# Altium integrated library Altium_MCU.IntLib: 42 symbols (continued)
## ESP32-S3-WROOM-1-N16
designator U?
Xtensa® 32-bit LX7 dual-core processor that operates at up to 240 MHz; Manufacturer: Espressif Systems; Supply Voltage - Max: 3.6 V; Supply Voltage - Min: 3 V; Flash size: 16MB; Part Number: ESP32-S3-WROOM-1-N16; Supplier 1 URL: N/A; Supplier 2 URL: https://www.digikey.com/en/products/detail/espressif-systems/ESP32-S3-WROOM-1-N16/16162647; Supplier 3 URL: N/A; Value: ESP32-S3-WROOM-1-N16; Manufacturer Part Number: ESP32-S3-WROOM-1-N16; Packaging: Tape and Reel; Supplier 1: Mouser; Supplier 1 Part Number: N/A; Supplier 2: Digi-Key; Supplier 2 Part Number: 1965-ESP32-S3-WROOM-1-N16TR-ND; Supplier 3: thegioiic; Supplier 3 Part Number: N/A; Mount: SMD/SMT; Operating Temperature Max: + 85 C; Operating Temperature Min: - 40 C; ComponentLink1Description: Datasheet; ComponentLink1URL: https://www.mouser.com/datasheet/2/891/esp32_s3_wroom_1_wroom_1u_datasheet_en-2930317.pdf; LCSC Part #: C2913199; Ram size: N/A
footprint ESP32_SOLO_OB_ANTENNA
pins: 1 GND, 2 VCC, 3 EN, 4 IO4, 5 IO5, 6 IO6, 7 IO7, 8 MTDO/IO15, 9 IO16, 10 IO17, 11 IO18, 12 IO8, 13 IO19, 14 IO20, 15 IO3, 16 IO46, 17 IO9, 18 IO10, 19 IO11, 20 IO12/MTDI, 21 IO13, 22 IO14, 23 IO21, 24 IO47, 25 IO48, 26 IO45, 27 IO0, 28 IO35, 29 IO36, 30 IO37, 31 IO38, 32 IO39, 33 IO40, 34 IO41, 35 IO42, 36 RXD0, 37 TXD0, 38 IO2, 39 IO1, 40 GND
text: ANTENNA INCLUDED

## ESP32-S3-WROOM-1-N16R8
designator U?
Xtensa® 32-bit LX7 dual-core processor that operates at up to 240 MHz; Manufacturer: Espressif Systems; Supply Voltage - Max: 3.6 V; Supply Voltage - Min: 3 V; Flash size: 16MB; Ram size: 8MB; Part Number: ESP32-S3-WROOM-1-N16R8; Supplier 1 URL: N/A; Supplier 2 URL: https://www.digikey.com/en/products/detail/espressif-systems/ESP32-S3-WROOM-1-N16R8/16162642; Supplier 3 URL: N/A; Value: ESP32-S3-WROOM-1-N16R8; Manufacturer Part Number: ESP32-S3-WROOM-1-N16R8; Packaging: Tape and Reel; Supplier 1: Mouser; Supplier 1 Part Number: N/A; Supplier 2: Digi-Key; Supplier 2 Part Number: 1965-ESP32-S3-WROOM-1-N16R8TR-ND; Supplier 3: thegioiic; Supplier 3 Part Number: N/A; Mount: SMD/SMT; Operating Temperature Max: + 85 C; Operating Temperature Min: - 40 C; ComponentLink1Description: Datasheet; ComponentLink1URL: https://www.mouser.com/datasheet/2/891/esp32_s3_wroom_1_wroom_1u_datasheet_en-2930317.pdf; LCSC Part #: C2913202
footprint ESP32_SOLO_OB_ANTENNA
pins: 1 GND, 2 VCC, 3 EN, 4 IO4, 5 IO5, 6 IO6, 7 IO7, 8 MTDO/IO15, 9 IO16, 10 IO17, 11 IO18, 12 IO8, 13 IO19, 14 IO20, 15 IO3, 16 IO46, 17 IO9, 18 IO10, 19 IO11, 20 IO12/MTDI, 21 IO13, 22 IO14, 23 IO21, 24 IO47, 25 IO48, 26 IO45, 27 IO0, 28 IO35, 29 IO36, 30 IO37, 31 IO38, 32 IO39, 33 IO40, 34 IO41, 35 IO42, 36 RXD0, 37 TXD0, 38 IO2, 39 IO1, 40 GND
text: ANTENNA INCLUDED

## ESP32-S3-WROOM-1U-N8R8
designator U?
Xtensa® 32-bit LX7 dual-core processor that operates at up to 240 MHz; Manufacturer: Espressif Systems; Supply Voltage - Max: 3.6 V; Supply Voltage - Min: 3 V; Flash size: 8MB; Part Number: ESP32-S3-WROOM-1U-N8R8; Supplier 1 URL: N/A; Supplier 2 URL: https://www.digikey.com/en/products/detail/espressif-systems/ESP32-S3-WROOM-1U-N8R8/16162638; Supplier 3 URL: N/A; Value: ESP32-S3-WROOM-1U-N8R8; Manufacturer Part Number: ESP32-S3-WROOM-1U-N8R8; Packaging: Tape and Reel; Supplier 1: Mouser; Supplier 1 Part Number: N/A; Supplier 2: Digi-Key; Supplier 2 Part Number: 1965-ESP32-S3-WROOM-1U-N8R8TR-ND; Supplier 3: thegioiic; Supplier 3 Part Number: N/A; Mount: SMD/SMT; Operating Temperature Max: + 85 C; Operating Temperature Min: - 40 C; ComponentLink1Description: Datasheet; ComponentLink1URL: https://www.mouser.com/datasheet/2/891/esp32_s3_wroom_1_wroom_1u_datasheet_en-2930317.pdf; LCSC Part #: C2980300; Ram size: 8MB
footprint ESP32_SOLO
pins: 1 GND, 2 VCC, 3 EN, 4 IO4, 5 IO5, 6 IO6, 7 IO7, 8 MTDO/IO15, 9 IO16, 10 IO17, 11 IO18, 12 IO8, 13 IO19, 14 IO20, 15 IO3, 16 IO46, 17 IO9, 18 IO10, 19 IO11, 20 IO12/MTDI, 21 IO13, 22 IO14, 23 IO21, 24 IO47, 25 IO48, 26 IO45, 27 IO0, 28 IO35, 29 IO36, 30 IO37, 31 IO38, 32 IO39, 33 IO40, 34 IO41, 35 IO42, 36 RXD0, 37 TXD0, 38 IO2, 39 IO1, 40 GND

## ESP32-S3-WROOM-1U-N16R2
designator U?
Xtensa® 32-bit LX7 dual-core processor that operates at up to 240 MHz; Manufacturer: Espressif Systems; Supply Voltage - Max: 3.6 V; Supply Voltage - Min: 3 V; Flash size: 16MB; Part Number: ESP32-S3-WROOM-1U-N16R2; Supplier 1 URL: N/A; Supplier 2 URL: https://www.digikey.com/en/products/detail/espressif-systems/ESP32-S3-WROOM-1U-N16R2/16162650; Supplier 3 URL: N/A; Value: ESP32-S3-WROOM-1U-N16R2; Manufacturer Part Number: ESP32-S3-WROOM-1U-N16R2; Packaging: Tape and Reel; Supplier 1: Mouser; Supplier 1 Part Number: N/A; Supplier 2: Digi-Key; Supplier 2 Part Number: 1965-ESP32-S3-WROOM-1U-N16R2TR-ND; Supplier 3: thegioiic; Supplier 3 Part Number: N/A; Mount: SMD/SMT; Operating Temperature Max: + 85 C; Operating Temperature Min: - 40 C; ComponentLink1Description: Datasheet; ComponentLink1URL: https://www.mouser.com/datasheet/2/891/esp32_s3_wroom_1_wroom_1u_datasheet_en-2930317.pdf; LCSC Part #: C3013945; Ram size: N/A
footprint ESP32_SOLO
pins: 1 GND, 2 VCC, 3 EN, 4 IO4, 5 IO5, 6 IO6, 7 IO7, 8 MTDO/IO15, 9 IO16, 10 IO17, 11 IO18, 12 IO8, 13 IO19, 14 IO20, 15 IO3, 16 IO46, 17 IO9, 18 IO10, 19 IO11, 20 IO12/MTDI, 21 IO13, 22 IO14, 23 IO21, 24 IO47, 25 IO48, 26 IO45, 27 IO0, 28 IO35, 29 IO36, 30 IO37, 31 IO38, 32 IO39, 33 IO40, 34 IO41, 35 IO42, 36 RXD0, 37 TXD0, 38 IO2, 39 IO1, 40 GND

## ESP32-S3-WROOM-1U-N16R8
designator U?
Xtensa® 32-bit LX7 dual-core processor that operates at up to 240 MHz; Manufacturer: Espressif Systems; Supply Voltage - Max: 3.6 V; Supply Voltage - Min: 3 V; Flash size: 16MB; Ram size: 8MB; Part Number: ESP32-S3-WROOM-1U-N16R8; Supplier 1 URL: N/A; Supplier 2 URL: https://www.digikey.com/en/products/detail/espressif-systems/ESP32-S3-WROOM-1U-N16R8/16162641; Supplier 3 URL: N/A; Value: ESP32-S3-WROOM-1U-N16R8; Manufacturer Part Number: ESP32-S3-WROOM-1U-N16R8; Packaging: Tape and Reel; Supplier 1: Mouser; Supplier 1 Part Number: N/A; Supplier 2: Digi-Key; Supplier 2 Part Number: 1965-ESP32-S3-WROOM-1U-N16R8TR-ND; Supplier 3: thegioiic; Supplier 3 Part Number: N/A; Mount: SMD/SMT; Operating Temperature Max: + 85 C; Operating Temperature Min: - 40 C; ComponentLink1Description: Datasheet; ComponentLink1URL: https://www.mouser.com/datasheet/2/891/esp32_s3_wroom_1_wroom_1u_datasheet_en-2930317.pdf; LCSC Part #: C3013946
footprint ESP32_SOLO
pins: 1 GND, 2 VCC, 3 EN, 4 IO4, 5 IO5, 6 IO6, 7 IO7, 8 MTDO/IO15, 9 IO16, 10 IO17, 11 IO18, 12 IO8, 13 IO19, 14 IO20, 15 IO3, 16 IO46, 17 IO9, 18 IO10, 19 IO11, 20 IO12/MTDI, 21 IO13, 22 IO14, 23 IO21, 24 IO47, 25 IO48, 26 IO45, 27 IO0, 28 IO35, 29 IO36, 30 IO37, 31 IO38, 32 IO39, 33 IO40, 34 IO41, 35 IO42, 36 RXD0, 37 TXD0, 38 IO2, 39 IO1, 40 GND

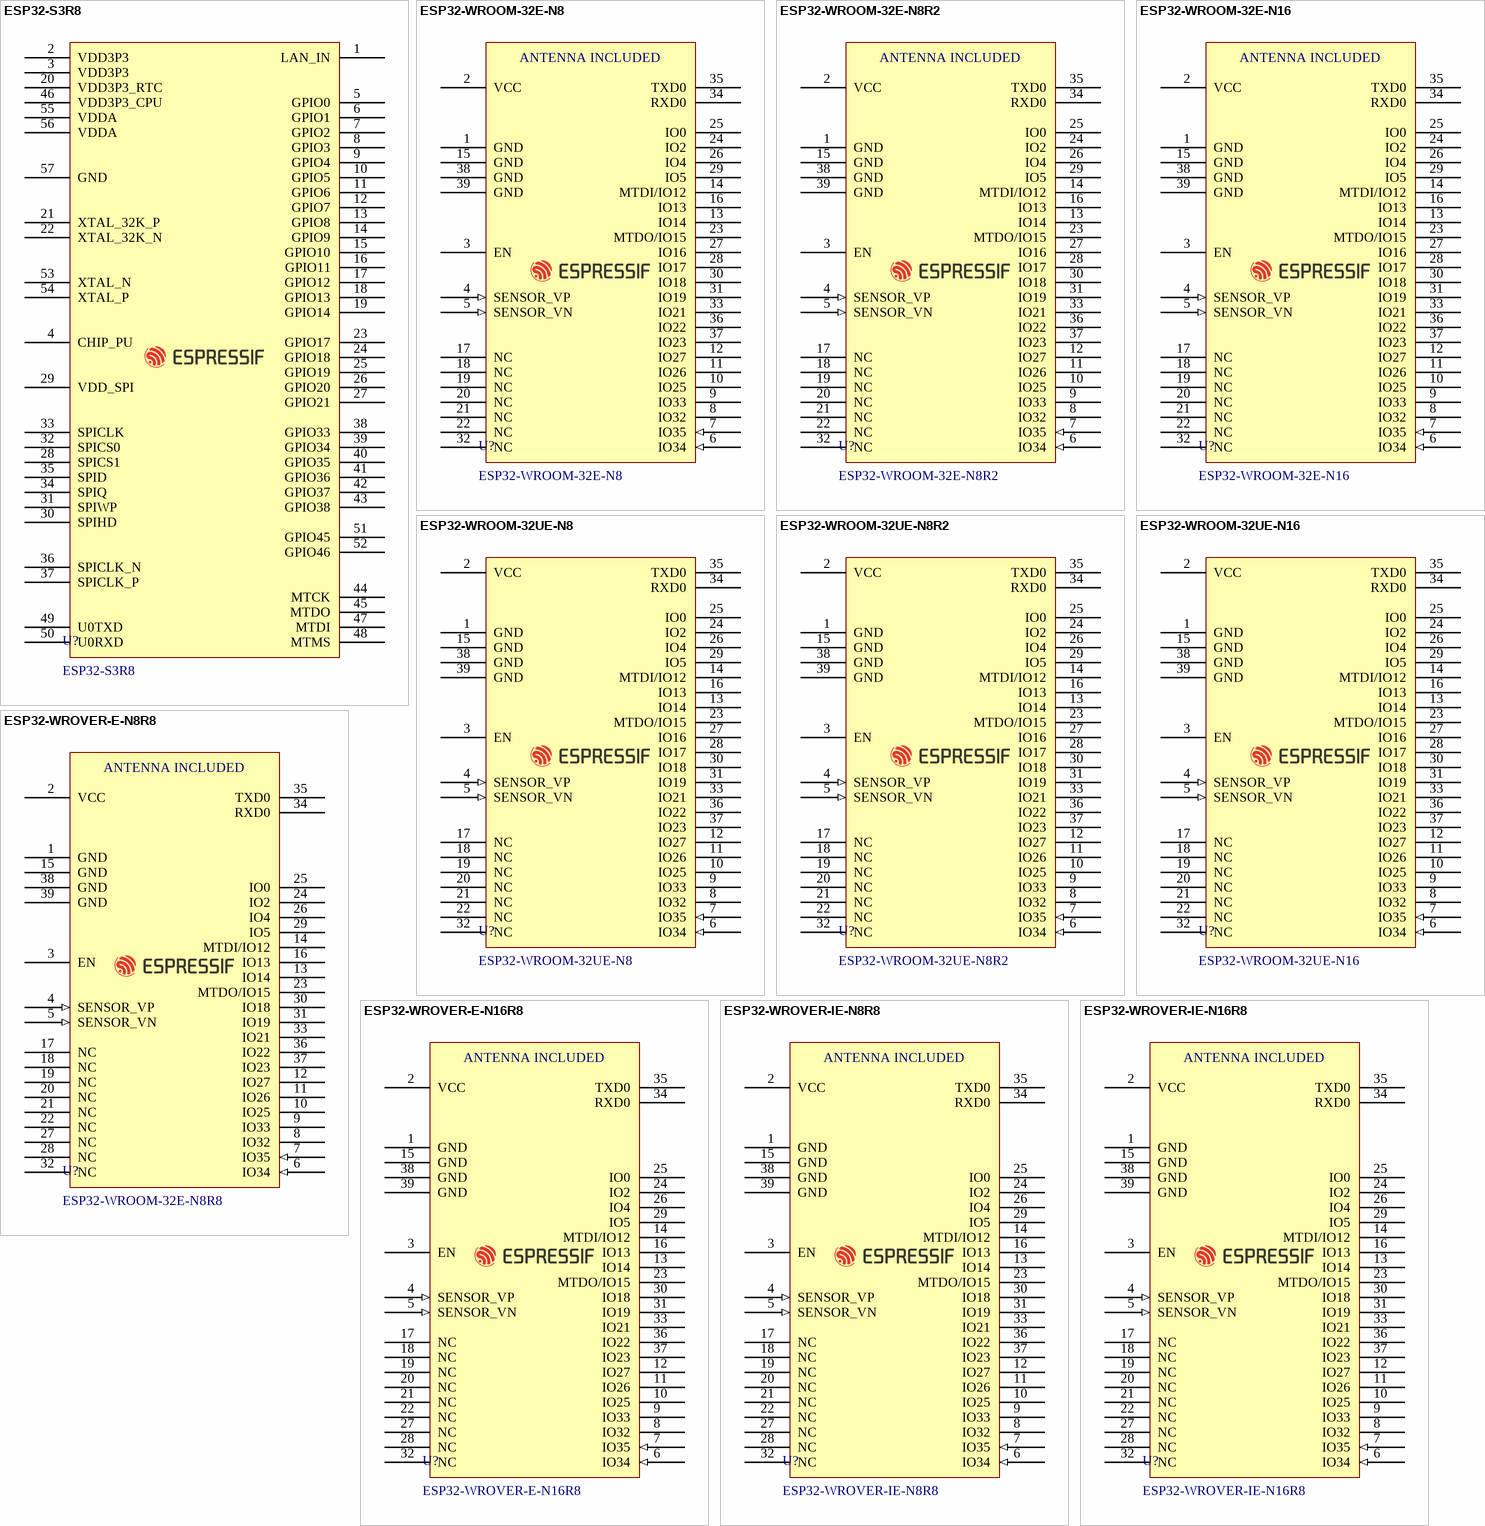
[diagram p2: symbols ESP32-S3R8 to ESP32-WROVER-IE-N16R8]

## ESP32-S3R8
designator U?
RF System on a Chip - SoC SMD IC ESP32-S3R8, dual-core MCU, Wi-Fi 2.4G & BLE 5.0 combo, 8 MB Octal SPI PSRAM die inside, QFN 56-pin, 7*7 mm; Manufacturer: Espressif Systems; Supply Voltage - Max: 3.6 V; Supply Voltage - Min: 3 V; Ram size: 8MB; Part Number: ESP32-S3R8; Supplier 1 URL: https://www.mouser.com/ProductDetail/Espressif-Systems/ESP32-S3R8?qs=Rp5uXu7WBW%252Bto4RqH8CMng%3D%3D; Supplier 2 URL: https://www.digikey.com/en/products/detail/espressif-systems/esp32-s3r8/15822451; Supplier 3 URL: N/A; Value: ESP32-S3R8; Manufacturer Part Number: ESP32-S3R8; Packaging: Tape and Reel; Supplier 1: Mouser; Supplier 1 Part Number: 356-ESP32-S3R8; Supplier 2: Digi-Key; Supplier 2 Part Number: 1904-ESP32-S3R8TR-ND; Supplier 3: thegioiic; Supplier 3 Part Number: N/A; Mount: SMD/SMT; Operating Temperature Max: + 85 C; Operating Temperature Min: - 40 C; ComponentLink1Description: Datasheet; ComponentLink1URL: https://www.lcsc.com/datasheet/C2913194.pdf; LCSC Part #: C2913194; Flash size: N/A
footprint QFN40P700X700X90_HS-57N (QFN, 56-Leads, Body 7.00x7.00mm, Pitch 0.40mm, Thermal Pad 4.00x4.00mm, IPC Medium Density)
pins: 1 LAN_IN, 2 VDD3P3, 3 VDD3P3, 4 CHIP_PU, 5 GPIO0, 6 GPIO1, 7 GPIO2, 8 GPIO3, 9 GPIO4, 10 GPIO5, 11 GPIO6, 12 GPIO7, 13 GPIO8, 14 GPIO9, 15 GPIO10, 16 GPIO11, 17 GPIO12, 18 GPIO13, 19 GPIO14, 20 VDD3P3_RTC, 21 XTAL_32K_P, 22 XTAL_32K_N, 23 GPIO17, 24 GPIO18, 25 GPIO19, 26 GPIO20, 27 GPIO21, 28 SPICS1, 29 VDD_SPI, 30 SPIHD, 31 SPIWP, 32 SPICS0, 33 SPICLK, 34 SPIQ, 35 SPID, 36 SPICLK_N, 37 SPICLK_P, 38 GPIO33, 39 GPIO34, 40 GPIO35, 41 GPIO36, 42 GPIO37, 43 GPIO38, 44 MTCK, 45 MTDO, 46 VDD3P3_CPU, 47 MTDI, 48 MTMS, 49 U0TXD, 50 U0RXD, 51 GPIO45, 52 GPIO46, 53 XTAL_N, 54 XTAL_P, 55 VDDA, 56 VDDA, 57 GND

## ESP32-WROOM-32E-N8
designator U?
These are ESP32-D0WD-based modules with integrated flash. These modules are well suited for Wi-Fi and Bluetooth/Bluetooth LE-based connectivity applications and provide a solid dual-core performance.; Manufacturer: Espressif Systems; Supply Voltage - Max: 3.6 V; Supply Voltage - Min: 3 V; Flash size: 8MB; Part Number: ESP32-WROOM-32E-N8; Supplier 1 URL: N/A; Supplier 2 URL: https://www.digikey.com/en/products/detail/espressif-systems/esp32-wroom-32e-n8/13159522; Supplier 3 URL: N/A; Value: ESP32-WROOM-32E-N8; Manufacturer Part Number: ESP32-WROOM-32E-N8; Packaging: Tape and Reel; Supplier 1: Mouser; Supplier 1 Part Number: N/A; Supplier 2: Digi-Key; Supplier 2 Part Number: 1965-ESP32-WROOM-32E-N8TR-ND; Supplier 3: thegioiic; Supplier 3 Part Number: N/A; Mount: SMD/SMT; Operating Temperature Max: + 85 C; Operating Temperature Min: - 40 C; ComponentLink1Description: Datasheet; ComponentLink1URL: https://www.mouser.com/datasheet/2/891/esp32_wroom_32e_esp32_wroom_32ue_datasheet_en-1855879.pdf; LCSC Part #: C701342; Ram size: N/A
footprint ESP32_WROOM_OB_ANTENNA
pins: 1 GND, 2 VCC, 3 EN, 4 SENSOR_VP (in), 5 SENSOR_VN (in), 6 IO34 (in), 7 IO35 (in), 8 IO32, 9 IO33, 10 IO25, 11 IO26, 12 IO27, 13 IO14, 14 MTDI/IO12, 15 GND, 16 IO13, 17 NC, 18 NC, 19 NC, 20 NC, 21 NC, 22 NC, 23 MTDO/IO15, 24 IO2, 25 IO0, 26 IO4, 27 IO16, 28 IO17, 29 IO5, 30 IO18, 31 IO19, 32 NC, 33 IO21, 34 RXD0, 35 TXD0, 36 IO22, 37 IO23, 38 GND, 39 GND
text: ANTENNA INCLUDED

## ESP32-WROOM-32E-N8R2
designator U?
These are ESP32-D0WD-based modules with integrated flash. These modules are well suited for Wi-Fi and Bluetooth/Bluetooth LE-based connectivity applications and provide a solid dual-core performance.; Manufacturer: Espressif Systems; Supply Voltage - Max: 3.6 V; Supply Voltage - Min: 3 V; Flash size: 8MB; Ram size: 2MB; Part Number: ESP32-WROOM-32E-N8R2; Supplier 1 URL: https://www.mouser.vn/ProductDetail/Espressif-Systems/ESP32-WROOM-32E-N8R2?qs=By6Nw2ByBD0mvGJSS3Ohlw%3D%3D; Supplier 2 URL: https://www.digikey.com/en/products/detail/espressif-systems/ESP32-WROOM-32E-N8R2/16733099?s=N4IgTCBcDaIKIGUAKBmMBaA6gJQPK4Fl0050A5ADmwgF0BfIA; Supplier 3 URL: N/A; Value: ESP32-WROOM-32E-N8R2; Manufacturer Part Number: ESP32-WROOM-32E-N8R2; Packaging: Tape and Reel; Supplier 1: Mouser; Supplier 1 Part Number: 356-ESP32WRM32EN8R2; Supplier 2: Digi-Key; Supplier 2 Part Number: 1965-ESP32-WROOM-32E-N8R2TR-ND; Supplier 3: thegioiic; Supplier 3 Part Number: N/A; Mount: SMD/SMT; Operating Temperature Max: + 85 C; Operating Temperature Min: - 40 C; ComponentLink1Description: Datasheet; ComponentLink1URL: https://www.mouser.com/datasheet/2/891/esp32_wroom_32e_esp32_wroom_32ue_datasheet_en-1855879.pdf; LCSC Part #: C5361945
footprint ESP32_WROOM_OB_ANTENNA
pins: 1 GND, 2 VCC, 3 EN, 4 SENSOR_VP (in), 5 SENSOR_VN (in), 6 IO34 (in), 7 IO35 (in), 8 IO32, 9 IO33, 10 IO25, 11 IO26, 12 IO27, 13 IO14, 14 MTDI/IO12, 15 GND, 16 IO13, 17 NC, 18 NC, 19 NC, 20 NC, 21 NC, 22 NC, 23 MTDO/IO15, 24 IO2, 25 IO0, 26 IO4, 27 IO16, 28 IO17, 29 IO5, 30 IO18, 31 IO19, 32 NC, 33 IO21, 34 RXD0, 35 TXD0, 36 IO22, 37 IO23, 38 GND, 39 GND
text: ANTENNA INCLUDED

## ESP32-WROOM-32E-N16
designator U?
These are ESP32-D0WD-based modules with integrated flash. These modules are well suited for Wi-Fi and Bluetooth/Bluetooth LE-based connectivity applications and provide a solid dual-core performance.; Manufacturer: Espressif Systems; Supply Voltage - Max: 3.6 V; Supply Voltage - Min: 3 V; Flash size: 16MB; Part Number: ESP32-WROOM-32E-N16; Supplier 1 URL: N/A; Supplier 2 URL: https://www.digikey.com/en/products/detail/espressif-systems/ESP32-WROOM-32E-16MB/11613144; Supplier 3 URL: N/A; Value: ESP32-WROOM-32E-N16; Manufacturer Part Number: ESP32-WROOM-32E-N16; Packaging: Tape and Reel; Supplier 1: Mouser; Supplier 1 Part Number: N/A; Supplier 2: Digi-Key; Supplier 2 Part Number: 1965-ESP32-WROOM-32E-N16TR-ND; Supplier 3: thegioiic; Supplier 3 Part Number: N/A; Mount: SMD/SMT; Operating Temperature Max: + 85 C; Operating Temperature Min: - 40 C; ComponentLink1Description: Datasheet; ComponentLink1URL: https://www.mouser.com/datasheet/2/891/esp32_wroom_32e_esp32_wroom_32ue_datasheet_en-1855879.pdf; LCSC Part #: C701343; Ram size: N/A
footprint ESP32_WROOM_OB_ANTENNA
pins: 1 GND, 2 VCC, 3 EN, 4 SENSOR_VP (in), 5 SENSOR_VN (in), 6 IO34 (in), 7 IO35 (in), 8 IO32, 9 IO33, 10 IO25, 11 IO26, 12 IO27, 13 IO14, 14 MTDI/IO12, 15 GND, 16 IO13, 17 NC, 18 NC, 19 NC, 20 NC, 21 NC, 22 NC, 23 MTDO/IO15, 24 IO2, 25 IO0, 26 IO4, 27 IO16, 28 IO17, 29 IO5, 30 IO18, 31 IO19, 32 NC, 33 IO21, 34 RXD0, 35 TXD0, 36 IO22, 37 IO23, 38 GND, 39 GND
text: ANTENNA INCLUDED

## ESP32-WROOM-32UE-N8
designator U?
These are ESP32-D0WD-based modules with integrated flash. These modules are well suited for Wi-Fi and Bluetooth/Bluetooth LE-based connectivity applications and provide a solid dual-core performance.; Manufacturer: Espressif Systems; Supply Voltage - Max: 3.6 V; Supply Voltage - Min: 3 V; Flash size: 8MB; Part Number: ESP32-WROOM-32UE-N8; Supplier 1 URL: N/A; Supplier 2 URL: https://www.digikey.com/en/products/detail/espressif-systems/ESP32-WROOM-32UE-8MB/11613142; Supplier 3 URL: N/A; Value: ESP32-WROOM-32UE-N8; Manufacturer Part Number: ESP32-WROOM-32UE-N8; Packaging: Tape and Reel; Supplier 1: Mouser; Supplier 1 Part Number: N/A; Supplier 2: Digi-Key; Supplier 2 Part Number: 1965-ESP32-WROOM-32UE-N8TR-ND; Supplier 3: thegioiic; Supplier 3 Part Number: N/A; Mount: SMD/SMT; Operating Temperature Max: + 85 C; Operating Temperature Min: - 40 C; ComponentLink1Description: Datasheet; ComponentLink1URL: https://www.mouser.com/datasheet/2/891/esp32_wroom_32e_esp32_wroom_32ue_datasheet_en-1855879.pdf; LCSC Part #: C701345; Ram size: N/A
footprint ESP32_WROOM
pins: 1 GND, 2 VCC, 3 EN, 4 SENSOR_VP (in), 5 SENSOR_VN (in), 6 IO34 (in), 7 IO35 (in), 8 IO32, 9 IO33, 10 IO25, 11 IO26, 12 IO27, 13 IO14, 14 MTDI/IO12, 15 GND, 16 IO13, 17 NC, 18 NC, 19 NC, 20 NC, 21 NC, 22 NC, 23 MTDO/IO15, 24 IO2, 25 IO0, 26 IO4, 27 IO16, 28 IO17, 29 IO5, 30 IO18, 31 IO19, 32 NC, 33 IO21, 34 RXD0, 35 TXD0, 36 IO22, 37 IO23, 38 GND, 39 GND

## ESP32-WROOM-32UE-N8R2
designator U?
These are ESP32-D0WD-based modules with integrated flash. These modules are well suited for Wi-Fi and Bluetooth/Bluetooth LE-based connectivity applications and provide a solid dual-core performance.; Manufacturer: Espressif Systems; Supply Voltage - Max: 3.6 V; Supply Voltage - Min: 3 V; Flash size: 8MB; Ram size: 2MB; Part Number: ESP32-WROOM-32UE-N8R2; Supplier 1 URL: N/A; Supplier 2 URL: https://www.digikey.com/en/products/detail/espressif-systems/ESP32-WROOM-32UE-N8R2/16733086?s=N4IgTCBcDaIKIGUAKBmMBaA6gJQPK4Fl00BVOdAOQA5sIBdAXyA; Supplier 3 URL: N/A; Value: ESP32-WROOM-32UE-N8R2; Manufacturer Part Number: ESP32-WROOM-32UE-N8R2; Packaging: Tape and Reel; Supplier 1: Mouser; Supplier 1 Part Number: N/A; Supplier 2: Digi-Key; Supplier 2 Part Number: 1965-ESP32-WROOM-32UE-N8R2TR-ND; Supplier 3: thegioiic; Supplier 3 Part Number: N/A; Mount: SMD/SMT; Operating Temperature Max: + 85 C; Operating Temperature Min: - 40 C; ComponentLink1Description: Datasheet; ComponentLink1URL: https://www.mouser.com/datasheet/2/891/esp32_wroom_32e_esp32_wroom_32ue_datasheet_en-1855879.pdf; LCSC Part #: N/A
footprint ESP32_WROOM
pins: 1 GND, 2 VCC, 3 EN, 4 SENSOR_VP (in), 5 SENSOR_VN (in), 6 IO34 (in), 7 IO35 (in), 8 IO32, 9 IO33, 10 IO25, 11 IO26, 12 IO27, 13 IO14, 14 MTDI/IO12, 15 GND, 16 IO13, 17 NC, 18 NC, 19 NC, 20 NC, 21 NC, 22 NC, 23 MTDO/IO15, 24 IO2, 25 IO0, 26 IO4, 27 IO16, 28 IO17, 29 IO5, 30 IO18, 31 IO19, 32 NC, 33 IO21, 34 RXD0, 35 TXD0, 36 IO22, 37 IO23, 38 GND, 39 GND

## ESP32-WROOM-32UE-N16
designator U?
These are ESP32-D0WD-based modules with integrated flash. These modules are well suited for Wi-Fi and Bluetooth/Bluetooth LE-based connectivity applications and provide a solid dual-core performance.; Manufacturer: Espressif Systems; Supply Voltage - Max: 3.6 V; Supply Voltage - Min: 3 V; Flash size: 16MB; Part Number: ESP32-WROOM-32UE-N16; Supplier 1 URL: N/A; Supplier 2 URL: https://www.digikey.com/en/products/detail/espressif-systems/ESP32-WROOM-32UE-16MB/11613145; Supplier 3 URL: N/A; Value: ESP32-WROOM-32UE-N16; Manufacturer Part Number: ESP32-WROOM-32UE-N16; Packaging: Tape and Reel; Supplier 1: Mouser; Supplier 1 Part Number: N/A; Supplier 2: Digi-Key; Supplier 2 Part Number: 1965-ESP32-WROOM-32UE-N16TR-ND; Supplier 3: thegioiic; Supplier 3 Part Number: N/A; Mount: SMD/SMT; Operating Temperature Max: + 85 C; Operating Temperature Min: - 40 C; ComponentLink1Description: Datasheet; ComponentLink1URL: https://www.mouser.com/datasheet/2/891/esp32_wroom_32e_esp32_wroom_32ue_datasheet_en-1855879.pdf; LCSC Part #: C701346; Ram size: N/A
footprint ESP32_WROOM
pins: 1 GND, 2 VCC, 3 EN, 4 SENSOR_VP (in), 5 SENSOR_VN (in), 6 IO34 (in), 7 IO35 (in), 8 IO32, 9 IO33, 10 IO25, 11 IO26, 12 IO27, 13 IO14, 14 MTDI/IO12, 15 GND, 16 IO13, 17 NC, 18 NC, 19 NC, 20 NC, 21 NC, 22 NC, 23 MTDO/IO15, 24 IO2, 25 IO0, 26 IO4, 27 IO16, 28 IO17, 29 IO5, 30 IO18, 31 IO19, 32 NC, 33 IO21, 34 RXD0, 35 TXD0, 36 IO22, 37 IO23, 38 GND, 39 GND

## ESP32-WROVER-E-N8R8
designator U?, comment ESP32-WROOM-32E-N8R8
The ESP32-WROVER series is based on ESP32-D0WD SoC, having also integrated flash memory and SPIRAM. It achieves a fine dual-core performance, and is well suited for applications requiring more memory, such as AIoT and gateway applications.; Part Number: ESP32-WROVER-E-N8R8; Manufacturer: Espressif Systems; Supply Voltage - Max: 3.6 V; Supply Voltage - Min: 3 V; Flash size: 8MB; Supplier 1 URL: N/A; Supplier 2 URL: https://www.digikey.com/en/products/detail/espressif-systems/ESP32-WROVER-E-8MB/11613126; Supplier 3 URL: N/A; Value: ESP32-WROOM-32E-N8R8; Manufacturer Part Number: ESP32-WROVER-E-N8R8; Packaging: Tape and Reel; Supplier 1: Mouser; Supplier 1 Part Number: N/A; Supplier 2: Digi-Key; Supplier 2 Part Number: 1965-ESP32-WROVER-E-N8R8TR-ND; Supplier 3: thegioiic; Supplier 3 Part Number: N/A; Mount: SMD/SMT; Operating Temperature Max: + 85 C; Operating Temperature Min: - 40 C; ComponentLink1Description: Datasheet; ComponentLink1URL: https://www.mouser.com/datasheet/2/891/esp32_wrover_e_esp32_wrover_ie_datasheet_en-1855913.pdf; LCSC Part #: N/A; Ram size: 8MB
footprint ESP32_WROVER_E
pins: 1 GND, 2 VCC, 3 EN, 4 SENSOR_VP (in), 5 SENSOR_VN (in), 6 IO34 (in), 7 IO35 (in), 8 IO32, 9 IO33, 10 IO25, 11 IO26, 12 IO27, 13 IO14, 14 MTDI/IO12, 15 GND, 16 IO13, 17 NC, 18 NC, 19 NC, 20 NC, 21 NC, 22 NC, 23 MTDO/IO15, 24 IO2, 25 IO0, 26 IO4, 27 NC, 28 NC, 29 IO5, 30 IO18, 31 IO19, 32 NC, 33 IO21, 34 RXD0, 35 TXD0, 36 IO22, 37 IO23, 38 GND, 39 GND
text: ANTENNA INCLUDED

## ESP32-WROVER-E-N16R8
designator U?
The ESP32-WROVER series is based on ESP32-D0WD SoC, having also integrated flash memory and SPIRAM. It achieves a fine dual-core performance, and is well suited for applications requiring more memory, such as AIoT and gateway applications.; Manufacturer: Espressif Systems; Supply Voltage - Max: 3.6 V; Supply Voltage - Min: 3 V; Flash size: 16MB; Ram size: 8MB; Part Number: ESP32-WROVER-E-N16R8; Supplier 1 URL: N/A; Supplier 2 URL: https://www.digikey.com/en/products/detail/espressif-systems/ESP32-WROVER-E-16MB/11613135; Supplier 3 URL: N/A; Value: ESP32-WROVER-E-N16R8; Manufacturer Part Number: ESP32-WROVER-E-N16R8; Packaging: Tape and Reel; Supplier 1: Mouser; Supplier 1 Part Number: N/A; Supplier 2: Digi-Key; Supplier 2 Part Number: 1965-ESP32-WROVER-E-N16R8TR-ND; Supplier 3: thegioiic; Supplier 3 Part Number: N/A; Mount: SMD/SMT; Operating Temperature Max: + 85 C; Operating Temperature Min: - 40 C; ComponentLink1Description: Datasheet; ComponentLink1URL: https://www.mouser.com/datasheet/2/891/esp32_wrover_e_esp32_wrover_ie_datasheet_en-1855913.pdf; LCSC Part #: N/A
footprint ESP32_WROVER_E
pins: 1 GND, 2 VCC, 3 EN, 4 SENSOR_VP (in), 5 SENSOR_VN (in), 6 IO34 (in), 7 IO35 (in), 8 IO32, 9 IO33, 10 IO25, 11 IO26, 12 IO27, 13 IO14, 14 MTDI/IO12, 15 GND, 16 IO13, 17 NC, 18 NC, 19 NC, 20 NC, 21 NC, 22 NC, 23 MTDO/IO15, 24 IO2, 25 IO0, 26 IO4, 27 NC, 28 NC, 29 IO5, 30 IO18, 31 IO19, 32 NC, 33 IO21, 34 RXD0, 35 TXD0, 36 IO22, 37 IO23, 38 GND, 39 GND
text: ANTENNA INCLUDED

## ESP32-WROVER-IE-N8R8
designator U?
The ESP32-WROVER series is based on ESP32-D0WD SoC, having also integrated flash memory and SPIRAM. It achieves a fine dual-core performance, and is well suited for applications requiring more memory, such as AIoT and gateway applications.; Manufacturer: Espressif Systems; Supply Voltage - Max: 3.6 V; Supply Voltage - Min: 3 V; Flash size: 8MB; Part Number: ESP32-WROVER-IE-N8R8; Supplier 1 URL: N/A; Supplier 2 URL: https://www.digikey.com/en/products/detail/espressif-systems/ESP32-WROVER-IE-8MB/11613139; Supplier 3 URL: N/A; Value: ESP32-WROVER-IE-N8R8; Manufacturer Part Number: ESP32-WROVER-IE-N8R8; Packaging: Tape and Reel; Supplier 1: Mouser; Supplier 1 Part Number: N/A; Supplier 2: Digi-Key; Supplier 2 Part Number: 1965-ESP32-WROVER-IE-N8R8TR-ND; Supplier 3: thegioiic; Supplier 3 Part Number: N/A; Mount: SMD/SMT; Operating Temperature Max: + 85 C; Operating Temperature Min: - 40 C; ComponentLink1Description: Datasheet; ComponentLink1URL: https://www.mouser.com/datasheet/2/891/esp32_wrover_e_esp32_wrover_ie_datasheet_en-1855913.pdf; LCSC Part #: N/A; Ram size: 8MB
footprint ESP32_WROVER_IE
pins: 1 GND, 2 VCC, 3 EN, 4 SENSOR_VP (in), 5 SENSOR_VN (in), 6 IO34 (in), 7 IO35 (in), 8 IO32, 9 IO33, 10 IO25, 11 IO26, 12 IO27, 13 IO14, 14 MTDI/IO12, 15 GND, 16 IO13, 17 NC, 18 NC, 19 NC, 20 NC, 21 NC, 22 NC, 23 MTDO/IO15, 24 IO2, 25 IO0, 26 IO4, 27 NC, 28 NC, 29 IO5, 30 IO18, 31 IO19, 32 NC, 33 IO21, 34 RXD0, 35 TXD0, 36 IO22, 37 IO23, 38 GND, 39 GND
text: ANTENNA INCLUDED

## ESP32-WROVER-IE-N16R8
designator U?
The ESP32-WROVER series is based on ESP32-D0WD SoC, having also integrated flash memory and SPIRAM. It achieves a fine dual-core performance, and is well suited for applications requiring more memory, such as AIoT and gateway applications.; Manufacturer: Espressif Systems; Supply Voltage - Max: 3.6 V; Supply Voltage - Min: 3 V; Flash size: 16MB; Ram size: 8MB; Part Number: ESP32-WROVER-IE-N16R8; Supplier 1 URL: N/A; Supplier 2 URL: https://www.digikey.com/en/products/detail/espressif-systems/ESP32-WROVER-IE-16MB/11613133; Supplier 3 URL: N/A; Value: ESP32-WROVER-IE-N16R8; Manufacturer Part Number: ESP32-WROVER-IE-N16R8; Packaging: Tape and Reel; Supplier 1: Mouser; Supplier 1 Part Number: N/A; Supplier 2: Digi-Key; Supplier 2 Part Number: 1965-ESP32-WROVER-IE-N16R8TR-ND; Supplier 3: thegioiic; Supplier 3 Part Number: N/A; Mount: SMD/SMT; Operating Temperature Max: + 85 C; Operating Temperature Min: - 40 C; ComponentLink1Description: Datasheet; ComponentLink1URL: https://www.mouser.com/datasheet/2/891/esp32_wrover_e_esp32_wrover_ie_datasheet_en-1855913.pdf; LCSC Part #: N/A
footprint ESP32_WROVER_IE
pins: 1 GND, 2 VCC, 3 EN, 4 SENSOR_VP (in), 5 SENSOR_VN (in), 6 IO34 (in), 7 IO35 (in), 8 IO32, 9 IO33, 10 IO25, 11 IO26, 12 IO27, 13 IO14, 14 MTDI/IO12, 15 GND, 16 IO13, 17 NC, 18 NC, 19 NC, 20 NC, 21 NC, 22 NC, 23 MTDO/IO15, 24 IO2, 25 IO0, 26 IO4, 27 NC, 28 NC, 29 IO5, 30 IO18, 31 IO19, 32 NC, 33 IO21, 34 RXD0, 35 TXD0, 36 IO22, 37 IO23, 38 GND, 39 GND

